# Altium footprint library PCBLIB.PcbLib: 557 footprints (part 4 of 36)
Each footprint in its own frame and in the unit in brackets; x right, y up, seen from the top. Pads: shape width x height; smd on the part's side, far side on the other; paste and mask are expansions set on the pad; w line width, h text height; cw(c..) or ccw(c..) is an arc to the next point about the centre after c.
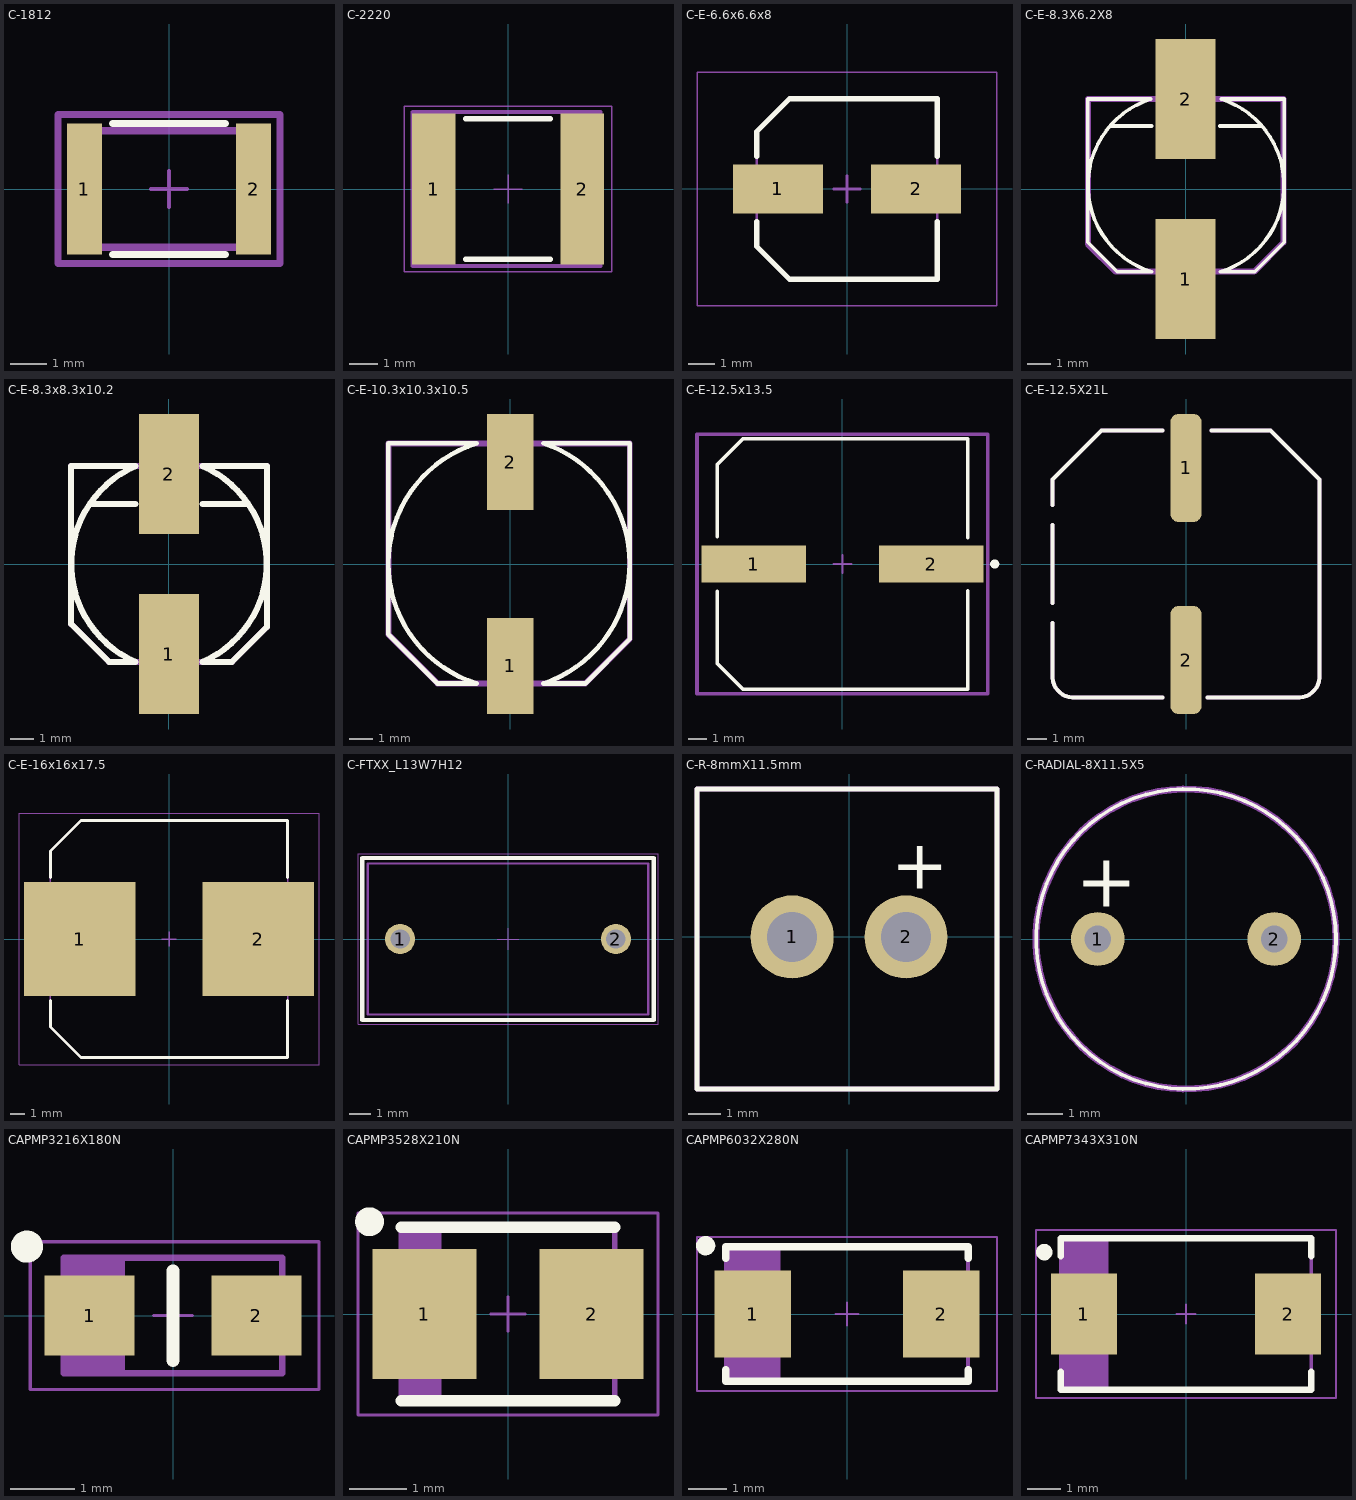
[diagram p3: the footprints below, top view; thin cyan lines are the x and y axes]

## C-1812 [mm]
pads (2):
  rect 0.953x3.603 smd paste+0 mask+0: 1(-2.325,0) 2(2.325,0)
Top Overlay:
  lines w0.2: -1.548,-1.802 1.548,-1.802 ; -1.548,1.802 1.548,1.802
Mechanical 15:
  lines w0.1: -0.5,0 0.5,0 ; 0,-0.5 0,0.5
  lines w0.2: -3.052,-2.052 3.052,-2.052 3.052,2.052 -3.052,2.052 -3.052,-2.052
ASM Top:
  lines w0.2: -2.25,-1.6 -2.25,1.6 2.25,1.6 2.25,-1.6 -2.25,-1.6
  text ".Designator" at 0,0.188 h1
3D body "Cap_TDK_CGA8L1X7S3A103M160KA_eec.STEP": height 3.5, standoff 0, extent -2.25,-1.6 2.25,1.6

## C-2220 [mm]
pads (2):
  rect 1.55x5.4 smd: 1(-2.65,0) 2(2.65,0)
Top Overlay:
  lines w0.2: -1.5,-2.5 1.5,-2.5 ; -1.5,2.5 1.5,2.5
Mechanical 15:
  lines w0.05: -0.5,0 0.5,0 ; 0,-0.5 0,0.5 ; -3.7,-2.95 -3.7,2.95 3.7,2.95 3.7,-2.95 -3.7,-2.95
ASM Top:
  lines w0.152: -3.4,-2.743 3.3,-2.743 3.3,2.743 -3.4,2.743 -3.4,-2.743
  text ".designator" at -1.6,-0.4 h0.8
3D body "User Library-SMD Ceramic Capacitors_2220 (5650)_JL.step": height 2, standoff 0, extent -2.896,-2.5 2.947,2.5

## C-E-6.6x6.6x8 [mm] "Aluminum Electrolytic Capacitor, Body 6,60x6,60x8,00mm, IPC Low Density"
height 8
pads (2):
  rect 3.4x1.85 smd: 1(-2.6,0) 2(2.6,0)
Top Overlay:
  lines w0.2: -3.4,-1.225 -3.4,-2.163 -2.163,-3.4 3.4,-3.4 3.4,-1.225 ; -3.4,1.225 -3.4,2.163 -2.163,3.4 3.4,3.4 3.4,1.225
Mechanical 15:
  lines w0.05: -5.65,-4.4 -5.65,4.4 5.65,4.4 5.65,-4.4 -5.65,-4.4
  lines w0.1: -0.5,0 0.5,0 ; 0,-0.5 0,0.5
ASM Top:
  lines w0.1: -3.4,-2.163 -3.4,2.163 -2.163,3.4 3.4,3.4 3.4,-3.4 -2.163,-3.4 -3.4,-2.163
  text ".designator" at 0.4,-2.9 h0.8
3D body "C-E-6.6x6.6x8.step": height 8, standoff 0, extent -3.85,-3.4 3.85,3.4

## C-E-8.3X6.2X8 [mm]
pads (2):
  rect 2.54x5.08 smd: 1(0,-3.81) 2(0,3.81)
Top Overlay:
  lines w0.152: -3.2,2.667 -1.448,2.667 ; 1.448,2.667 3.226,2.667 ; -4.14,-2.261 -2.896,-3.505 -1.448,-3.505 cw(c-0.304,0.156) -1.473,3.81 -4.14,3.81 -4.14,-2.261 ; 1.473,-3.505 ccw(c0.33,0.156) 1.499,3.81 4.166,3.81 4.166,-2.261 2.921,-3.505 1.473,-3.505
ASM Top:
  lines w0.254: -4.14,-2.331 -4.14,3.8 -3.571,3.8 4.14,3.8 4.14,-2.26 2.9,-3.5 -2.971,-3.5 -4.14,-2.331
  text ".designator" at -2.642,-0.203 h0.8
3D body "C-8.3X8.3X8.step": height 6.52, standoff 0.01, extent -4.216,-4.961 4.284,4.639

## C-E-8.3x8.3x10.2 [mm]
pads (2):
  rect 2.54x5.08 smd mask+0: 1(0,-3.81) 2(0,3.81)
Top Overlay:
  lines w0.254: -3.327,2.54 -1.422,2.54 ; 1.422,2.54 3.302,2.54 ; -4.14,-2.54 -2.54,-4.14 -1.422,-4.14 cw(c0.372,0) -1.422,4.14 -4.14,4.14 -4.14,-2.54 ; 1.422,-4.14 ccw(c-0.372,0) 1.422,4.14 4.14,4.14 4.14,-2.667 2.667,-4.14 1.422,-4.14
ASM Top:
  lines w0.254: -4.14,-2.54 -4.14,4.14 -3.912,4.14 4.14,4.14 4.14,-2.667 2.667,-4.14 -2.54,-4.14 -4.14,-2.54
  text ".designator" at -2.642,-0.203 h0.8
3D body "EDH107M050A9MAA.step": height 10.52, standoff 0.01, extent -4.258,-5.232 4.242,5.268

## C-E-10.3x10.3x10.5 [mm]
height 10.5
pads (2):
  rect 2x4.1 smd mask+0: 1(0,-4.35) 2(0,4.35)
Top Overlay:
  lines w0.2: -5.2,-3 -3.1,-5.1 -1.422,-5.1 cw(c0.163,0.025) -1.422,5.15 -5.2,5.15 -5.2,-3 ; 1.422,-5.1 ccw(c-0.309,0.025) 1.422,5.15 5.1,5.15 5.1,-3.2 3.2,-5.1 1.422,-5.1
ASM Top:
  lines w0.254: -5.2,-3 -3.1,-5.1 3.2,-5.1 5.1,-3.2 5.1,5.15 -5.2,5.15 -5.2,3.74 -5.2,-3
  text ".designator" at -2.642,-0.203 h0.8
3D body "10x10_Chip.stp": height 10, standoff 0, extent -5.15,-5.45 5.15,5.45

## C-E-12.5x13.5 [mm]
height 13.5
pads (2):
  rect 5.7x2 smd paste+0 mask+0: 1(-4.85,0) 2(4.85,0)
Top Overlay:
  circle w0.25: c8.325,0 r0.125
  lines w0.2: -6.85,-1.5 -6.85,-5.436 -5.436,-6.85 6.85,-6.85 6.85,-1.475 ; -6.85,1.5 -6.85,5.436 -5.436,6.85 6.85,6.85 ; 6.85,1.45 6.85,6.825
Mechanical 15:
  lines w0.1: -0.5,0 0.5,0 ; 0,-0.5 0,0.5
  lines w0.2: -7.95,-7.1 7.95,-7.1 7.95,7.1 -7.95,7.1 -7.95,-7.1
ASM Top:
  circle w0.2: c6.2,0 r0.1
  lines w0.2: -7.95,-7.1 7.95,-7.1 7.95,7.1 -7.95,7.1 -7.95,-7.1
  text ".designator" at 0.3,-0.3 h1.5
3D body "12.5X13.5_Chip.stp": height 13.5, standoff 0, extent -7.3,-6.8 7.3,6.8

## C-E-12.5X21L [mm]
pads (2):
  rrect50% 1.6x5.5 smd: 1(0,4.9) 2(0,-4.9)
Top Overlay:
  lines w0.2: -6.8,-3 -6.8,-5.8 ccw(c-5.775,-5.775) -5.8,-6.8 ; -6.8,-2 -6.8,2 ; -6.8,3 -6.8,4.3 -4.3,6.8 -1.2,6.8 ; 1.3,6.8 4.3,6.8 6.8,4.3 6.8,-5.8 cw(c5.775,-5.775) 5.8,-6.8 ; -5.8,-6.8 ccw(c-5.8,-6.8) -5.8,-6.8 ; -5.8,-6.8 -1.2,-6.8 ; -1.2,-6.8 ccw(c-1.2,-6.8) -1.2,-6.8 ; 1.1,-6.8 ccw(c1.1,-6.8) 1.1,-6.8 ; 1.1,-6.8 5.8,-6.8 ; 5.8,-6.8 ccw(c5.8,-6.8) 5.8,-6.8
ASM Top:
  lines w0.2: -6.8,-5.801 ccw(c-5.776,-5.776) -5.801,-6.8 ; -6.8,-5.776 -6.8,-3 ; -6.8,-2 -6.8,2 ; -6.8,3 -6.8,4.3 -4.3,6.8 -1.2,6.8 ; -5.776,-6.8 -1.2,-6.8 ; 1.3,6.8 4.3,6.8 6.8,4.3 6.8,-5.8 cw(c5.775,-5.775) 5.8,-6.8 ; -1.2,-6.8 ccw(c-1.2,-6.8) -1.2,-6.8 ; 1.1,-6.8 ccw(c1.1,-6.8) 1.1,-6.8 ; 1.1,-6.8 5.8,-6.8 ; 5.8,-6.8 ccw(c5.8,-6.8) 5.8,-6.8 ; -5.8,-6.8 ccw(c-5.8,-6.8) -5.8,-6.8
  text ".designator" at -1.5,-0.3 h0.8
3D body "12.5x21_Chip.stp": height 21.01, standoff 0.01, extent -6.8,-7.3 6.8,7.3

## C-E-16x16x17.5 [mm] "Aluminum Electrolytic Capacitor, Body 16.60x16.60x17.50mm, IPC Medium Density"
height 17.5
pads (2):
  rect 7.8x8 smd: 1(-6.25,0) 2(6.25,0)
Top Overlay:
  lines w0.2: -8.3,-4.3 -8.3,-6.15 -6.15,-8.3 8.3,-8.3 8.3,-4.3 ; -8.3,4.3 -8.3,6.15 -6.15,8.3 8.3,8.3 8.3,4.3
Mechanical 15:
  lines w0.05: -10.5,-8.8 10.5,-8.8 10.5,8.8 -10.5,8.8 -10.5,-8.8
  lines w0.1: -0.5,0 0.5,0 ; 0,-0.5 0,0.5
ASM Top:
  lines w0.1: -8.3,-6.15 -8.3,6.15 -6.15,8.3 8.3,8.3 8.3,-8.3 -6.15,-8.3 -8.3,-6.15
  text ".designator" at 0.103,-1.142 h0.8
3D body "C-E-16x16x17.5.step": height 17.5, standoff 0, extent -9.15,-8.3 9.15,8.3

## C-FTXX_L13W7H12 [mm] "Film Capacitors, 13x7x12mm"
height 12
pads (2):
  round 1.4 hole 0.9: 1(-5,0) 2(5,0)
Top Overlay:
  lines w0.2: -6.75,-3.75 -6.75,3.75 6.75,3.75 6.75,-3.75 -6.75,-3.75
Mechanical 15:
  lines w0.05: -0.5,0 0.5,0 ; 0,-0.5 0,0.5 ; -6.95,-3.95 -6.95,3.95 6.95,3.95 6.95,-3.95 -6.95,-3.95
ASM Top:
  lines w0.1: -6.5,-3.5 -6.5,3.5 6.5,3.5 6.5,-3.5 -6.5,-3.5
  text ".designator" at -0.5,-0.2 h1.5
3D body "10x13x12x7.stp": height 12.05, standoff -19.95, extent -6.5,-3.5 6.5,3.5

## C-R-8mmX11.5mm [mil]
pads (2):
  round 100 hole 60: 1(-68.5,0) 2(68.5,0)
Top Overlay:
  lines w6: -183,-183 178,-183 178,178 -183,178 -183,-183
  text "+" at 51,58 h60
ASM Top:
  lines w6: -183,-183 178,-183 178,178 -183,178 -183,-183
  text ".designator" at -33.14,-2.23 h31.5
3D body "CapAluRadial_D80H115.STEP": height 512.81, standoff -117.11, extent -170,-169.45 164.64,165

## C-RADIAL-8X11.5X5 [mil]
pads (2):
  round 60 hole 30: 1(-98.43,0) 2(98.43,0)
Top Overlay:
  circle w4: c0,0 r167.3
  text "+" at -123,36 h60
ASM Top:
  circle w7.87: c0,0 r167.3
  text ".designator" at -21,-1 h31.5
3D body "C-RADÝAL-8X11.5X5.step": height 630.18, standoff -393.76, extent -165.75,-165 168.89,170

## CAPMP3216X180N [mm] "Capacitor, Polarized, Molded  Body 3.2x1.6mm, IPC Medium Density"
height 1.8
pads (2):
  rect 1.4x1.25 smd: 1(-1.3,0) 2(1.3,0)
Top Overlay:
  circle w0.25: c-2.275,1.075 r0.125
  lines w0.2: 0,-0.7 0,0.7
Mechanical 14:
  lines w0.1: -1.625,-0.9 -1.625,0.9 ; -1.55,-0.9 -1.55,0.9 ; -1.475,-0.9 -1.475,0.9 ; -1.4,-0.9 -1.4,0.9 ; -1.325,-0.9 -1.325,0.9 ; -1.25,-0.9 -1.25,0.9 ; -1.175,-0.9 -1.175,0.9 ; -1.1,-0.9 -1.1,0.9 ; -1.025,-0.9 -1.025,0.9 ; -0.95,-0.9 -0.95,0.9 ; -0.875,-0.9 -0.875,0.9 ; -1.7,-0.9 -1.7,0.9 1.7,0.9 1.7,-0.9 -1.7,-0.9 ; -0.8,-0.9 -0.8,0.9 -0.8,-0.9
Mechanical 15:
  lines w0.05: -0.3,0 0.3,0 ; 0,-0.3 0,0.3 ; -2.225,-1.15 2.275,-1.15 2.275,1.15 -2.225,1.15 -2.225,-1.15
3D body "CAPMP3216X180N.stp": height 1.6, standoff 0, extent -1.7,-0.9 1.7,0.9

## CAPMP3528X210N [mm] "Capacitor, Polarized, Molded  Body 3.5x2.8mm, IPC Medium Density"
height 2.1
pads (2):
  rect 1.8x2.25 smd: 1(-1.45,0) 2(1.45,0)
Top Overlay:
  circle w0.25: c-2.4,1.6 r0.125
  lines w0.2: -1.85,-1.5 1.85,-1.5 ; -1.85,1.5 1.85,1.5
Mechanical 14:
  lines w0.1: -1.8,-1.5 -1.8,1.5 ; -1.725,-1.5 -1.725,1.5 ; -1.65,-1.5 -1.65,1.5 ; -1.575,-1.5 -1.575,1.5 ; -1.5,-1.5 -1.5,1.5 ; -1.425,-1.5 -1.425,1.5 ; -1.35,-1.5 -1.35,1.5 ; -1.275,-1.5 -1.275,1.5 ; -1.2,-1.5 -1.2,1.5 ; -1.85,-1.5 1.85,-1.5 1.85,1.5 -1.85,1.5 -1.85,-1.5
Mechanical 15:
  lines w0.05: -0.3,0 0.3,0 ; 0,-0.3 0,0.3 ; -2.6,-1.75 -2.6,1.75 2.6,1.75 2.6,-1.75 -2.6,-1.75
3D body "CAPMP3528X210N.stp": height 2.1, standoff 0, extent -1.85,-1.5 1.85,1.5

## CAPMP6032X280N [mm] "Capacitor, Polarized, Molded  Body 6.0x3.2mm, IPC Medium Density"
height 2.8
pads (2):
  rect 2x2.25 smd: 1(-2.45,0) 2(2.45,0)
Top Overlay:
  circle w0.25: c-3.675,1.775 r0.125
  lines w0.2: -3.15,-1.45 -3.15,-1.75 3.15,-1.75 3.15,-1.45 ; -3.15,1.45 -3.15,1.75 3.15,1.75 3.15,1.45
Mechanical 14:
  lines w0.1: -3.05,-1.725 -3.05,1.75 ; -2.975,-1.725 -2.975,1.75 ; -2.9,-1.725 -2.9,1.75 ; -2.825,-1.725 -2.825,1.75 ; -2.75,-1.725 -2.75,1.75 ; -2.675,-1.725 -2.675,1.75 ; -2.6,-1.725 -2.6,1.75 ; -2.525,-1.725 -2.525,1.75 ; -2.45,-1.725 -2.45,1.75 ; -2.375,-1.725 -2.375,1.75 ; -2.3,-1.725 -2.3,1.75 ; -2.225,-1.725 -2.225,1.75 ; -2.15,-1.725 -2.15,1.75 ; -2.075,-1.725 -2.075,1.75 ; -2,-1.725 -2,1.75 ; -1.925,-1.725 -1.925,1.75 ; -1.85,-1.725 -1.85,1.75 ; -1.775,-1.725 -1.775,1.75 ; -3.15,-1.725 3.15,-1.725 3.15,1.75 -3.15,1.75 -3.15,-1.725
Mechanical 15:
  lines w0.05: -0.3,0 0.3,0 ; 0,-0.3 0,0.3 ; -3.9,-2 3.9,-2 3.9,2 -3.9,2 -3.9,-2
3D body "CAPMP6032X280N.stp": height 2.8, standoff 0, extent -3.15,-1.75 3.15,1.75

## CAPMP7343X310N [mm] "Capacitor, Polarized, Molded  Body 7.3x4.3mm, IPC Medium Density"
height 3.1
pads (2):
  rect 2x2.45 smd: 1(-3.1,0) 2(3.1,0)
Top Overlay:
  circle w0.25: c-4.3,1.875 r0.125
  lines w0.2: -3.8,-1.75 -3.8,-2.3 3.8,-2.3 3.8,-1.75 ; -3.8,1.75 -3.8,2.3 3.8,2.3 3.8,1.75
Mechanical 14:
  lines w0.1: -3.75,-2.3 -3.75,2.3 ; -3.675,-2.3 -3.675,2.3 ; -3.6,-2.3 -3.6,2.3 ; -3.525,-2.3 -3.525,2.3 ; -3.45,-2.3 -3.45,2.3 ; -3.375,-2.3 -3.375,2.3 ; -3.3,-2.3 -3.3,2.3 ; -3.225,-2.3 -3.225,2.3 ; -3.15,-2.3 -3.15,2.3 ; -3.075,-2.3 -3.075,2.3 ; -3,-2.3 -3,2.3 ; -2.925,-2.3 -2.925,2.3 ; -2.85,-2.3 -2.85,2.3 ; -2.775,-2.3 -2.775,2.3 ; -2.7,-2.3 -2.7,2.3 ; -2.625,-2.3 -2.625,2.3 ; -2.55,-2.3 -2.55,2.3 ; -2.475,-2.3 -2.475,2.3 ; -2.4,-2.3 -2.4,2.3 ; -3.8,-2.3 -3.8,2.3 3.8,2.3 3.8,-2.3 -3.8,-2.3
Mechanical 15:
  lines w0.05: -0.3,0 0.3,0 ; 0,-0.3 0,0.3 ; -4.55,-2.55 -4.55,2.55 4.55,2.55 4.55,-2.55 -4.55,-2.55
3D body "CAPMP7343X310N.stp": height 3.1, standoff 0, extent -3.8,-2.3 3.8,2.3